# Altium footprint library Receiver_Library.PcbLib: 29 footprints (part 2 of 2)
Each footprint in its own frame and in the unit in brackets; x right, y up, seen from the top. Pads: shape width x height; smd on the part's side, far side on the other; paste and mask are expansions set on the pad; w line width, h text height; cw(c..) or ccw(c..) is an arc to the next point about the centre after c.
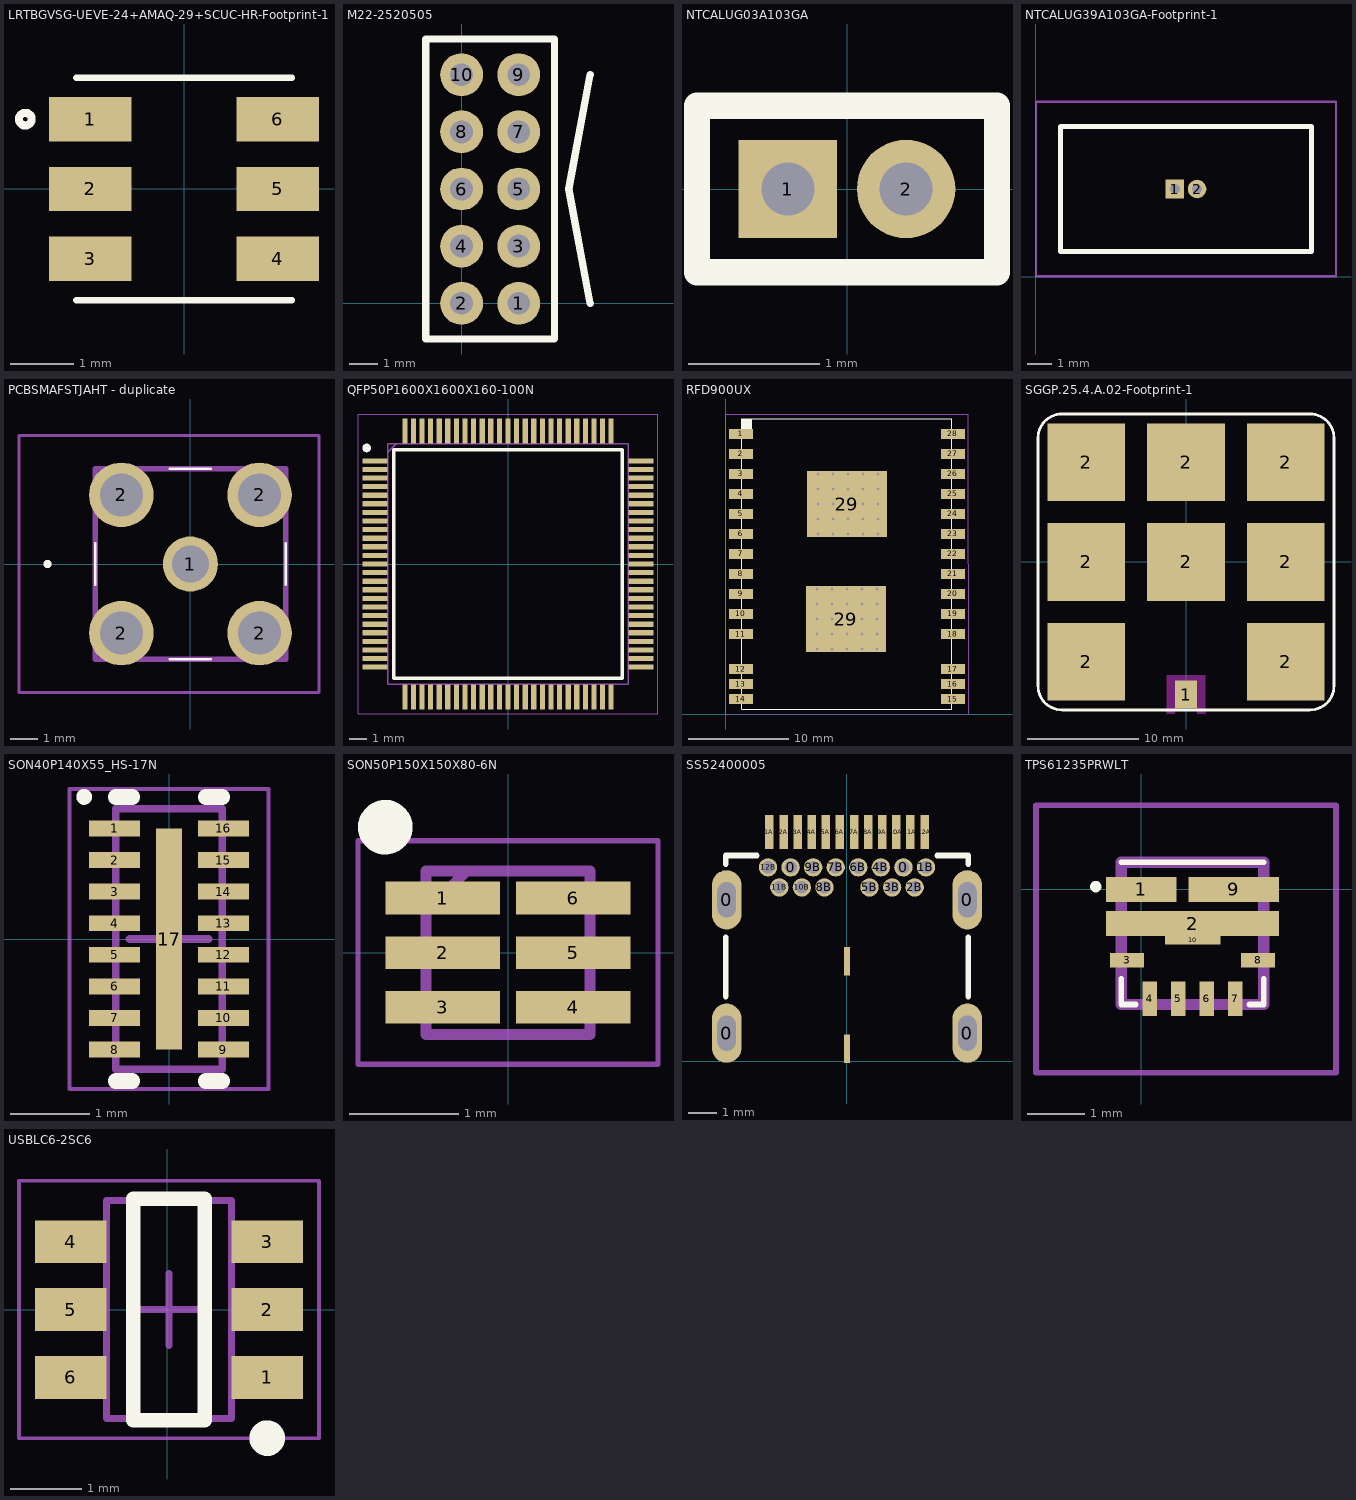
[diagram p1: the footprints below, top view; thin cyan lines are the x and y axes]

## LRTBGVSG-UEVE-24+AMAQ-29+SCUC-HR-Footprint-1 [mm]
pads (6):
  rect 1.3x0.7 smd: 1(-1.475,1.1) 2(-1.475,0) 3(-1.475,-1.1) 4(1.475,-1.1) 5(1.475,0) 6(1.475,1.1)
Top Overlay:
  circle w0.127: c-2.5,1.1 r0.1
  lines w0.1: -1.7,-1.75 1.7,-1.75 ; -1.7,1.75 1.7,1.75
3D body "LRTB_GVSG_20130110_geometry.STEP": height 1.8, standoff -0.03, extent -1.7,-1.65 1.7,1.65

## M22-2520505 [mm]
pads (10):
  round 1.5 hole 0.8: 1(2,0) 2(0,0) 3(2,2) 4(0,2) 5(2,4) 6(0,4) 7(2,6) 8(0,6) 9(2,8) 10(0,8)
Top Overlay:
  lines w0.254: 4.5,0 3.75,4 4.5,8 ; -1.25,-1.25 3.25,-1.25 3.25,9.25 -1.25,9.25 -1.25,-1.25
3D body "BF050-10-A-A-0350-0230-N-G.stp": height 5, standoff -2.3, extent -1,-1 3,9

## NTCALUG03A103GA [mm]
pads (2):
  rect 0.75x0.75 hole 0.402: 1(-0.45,0)
  round 0.75 hole 0.402: 2(0.45,0)
Top Overlay:
  lines w0.2: -1.143,-0.635 1.143,-0.635 1.143,0.635 -1.143,0.635 -1.143,-0.635
Mechanical 13:
  lines w0.1: -1.143,-0.635 1.143,-0.635 1.143,0.635 -1.143,0.635 -1.143,-0.635
Mechanical 15:
  lines w0.1: -1.143,-0.635 -1.143,0.635 1.143,0.635 1.143,-0.635 -1.143,-0.635
3D body "NTCALUG39A103GA.stp": height 79.21, standoff -2.32, extent -2.75,-1.65 2.75,1.738

## NTCALUG39A103GA-Footprint-1 [mm]
pads (2):
  rect 0.75x0.75 hole 0.402: 1(5.646,3.556)
  round 0.75 hole 0.402: 2(6.546,3.556)
Top Overlay:
  lines w0.2: 1.016,1.016 11.176,1.016 11.176,6.096 1.016,6.096 1.016,1.016
Mechanical 13:
  lines w0.1: 1.016,1.016 11.176,1.016 11.176,6.096 1.016,6.096 1.016,1.016
Mechanical 15:
  lines w0.1: 0.016,0.016 12.176,0.016 12.176,7.096 0.016,7.096 0.016,0.016
3D body "NTCALUG39A103GA.stp": height 79.21, standoff -2.32, extent 3.346,1.906 8.846,5.294

## PCBSMAFSTJAHT - duplicate [mm]
pads (5):
  round 2.025 hole 1.35: 1(0,0)
  round 2.37 hole 1.58: 2(-2.54,-2.54) 2(-2.54,2.54) 2(2.54,-2.54) 2(2.54,2.54)
Top Overlay:
  lines w0.1: -3.5,-0.75 -3.5,0.75 -3.5,-0.75 ; -0.75,-3.5 0.75,-3.5 -0.75,-3.5 ; -0.75,3.5 0.75,3.5 -0.75,3.5 ; 3.5,-0.75 3.5,0.75 3.5,-0.75
  lines w0.2: -5.3,0 ccw(c-5.25,0) -5.2,0 ; -5.3,0 cw(c-5.25,0) -5.2,0 ; -5.3,0 ccw(c-5.25,0) -5.2,0
Mechanical 13:
  lines w0.2: -3.5,-3.5 3.5,-3.5 3.5,3.5 -3.5,3.5 -3.5,-3.5
Mechanical 15:
  lines w0.1: -6.3,-4.725 4.725,-4.725 4.725,4.725 -6.3,4.725 -6.3,-4.725
3D body "PCB.SMAFSTJ.A.HT.stp": height 11, standoff 0, extent -3.61,-3.5 3.39,3.5

## QFP50P1600X1600X160-100N [mm]
pads (100):
  rect 1.475x0.3 smd: 1(-7.738,6) 2(-7.738,5.5) 3(-7.738,5) 4(-7.738,4.5) 5(-7.738,4) 6(-7.738,3.5) 7(-7.738,3) 8(-7.738,2.5) 9(-7.738,2) 10(-7.738,1.5) 11(-7.738,1) 12(-7.738,0.5) 13(-7.738,0) 14(-7.738,-0.5) 15(-7.738,-1) 16(-7.738,-1.5) 17(-7.738,-2) 18(-7.738,-2.5) 19(-7.738,-3) 20(-7.738,-3.5) 21(-7.738,-4) 22(-7.738,-4.5) 23(-7.738,-5) 24(-7.738,-5.5) 25(-7.738,-6) 51(7.738,-6) 52(7.738,-5.5) 53(7.738,-5) 54(7.738,-4.5) 55(7.738,-4) 56(7.738,-3.5) 57(7.738,-3) 58(7.738,-2.5) 59(7.738,-2) 60(7.738,-1.5) 61(7.738,-1) 62(7.738,-0.5) 63(7.738,0) 64(7.738,0.5) 65(7.738,1) 66(7.738,1.5) 67(7.738,2) 68(7.738,2.5) 69(7.738,3) 70(7.738,3.5) 71(7.738,4) 72(7.738,4.5) 73(7.738,5) 74(7.738,5.5) 75(7.738,6)
  rect 0.3x1.475 smd: 26(-6,-7.738) 27(-5.5,-7.738) 28(-5,-7.738) 29(-4.5,-7.738) 30(-4,-7.738) 31(-3.5,-7.738) 32(-3,-7.738) 33(-2.5,-7.738) 34(-2,-7.738) 35(-1.5,-7.738) 36(-1,-7.738) 37(-0.5,-7.738) 38(0,-7.738) 39(0.5,-7.738) 40(1,-7.738) 41(1.5,-7.738) 42(2,-7.738) 43(2.5,-7.738) 44(3,-7.738) 45(3.5,-7.738) 46(4,-7.738) 47(4.5,-7.738) 48(5,-7.738) 49(5.5,-7.738) 50(6,-7.738) 76(6,7.738) 77(5.5,7.738) 78(5,7.738) 79(4.5,7.738) 80(4,7.738) 81(3.5,7.738) 82(3,7.738) 83(2.5,7.738) 84(2,7.738) 85(1.5,7.738) 86(1,7.738) 87(0.5,7.738) 88(0,7.738) 89(-0.5,7.738) 90(-1,7.738) 91(-1.5,7.738) 92(-2,7.738) 93(-2.5,7.738) 94(-3,7.738) 95(-3.5,7.738) 96(-4,7.738) 97(-4.5,7.738) 98(-5,7.738) 99(-5.5,7.738) 100(-6,7.738)
Top Overlay:
  circle w0.25: c-8.225,6.75 r0.125
  lines w0.2: -6.65,-6.65 6.65,-6.65 6.65,6.65 -6.65,6.65 -6.65,-6.65
Mechanical 13:
  lines w0.1: -7,6.5 -6.5,7 ; -7,-7 7,-7 7,7 -7,7 -7,-7
Mechanical 15:
  lines w0.05: -8.725,-8.725 8.725,-8.725 8.725,8.725 -8.725,8.725 -8.725,-8.725
3D body "STM32L552VET6.stp": height 1.6, standoff 0, extent -8,-8 8,8

## RFD900UX [mm]
pads (30):
  rect 2.4x1 smd: 1(1.5,28) 2(1.5,26) 3(1.5,24) 4(1.5,22) 5(1.5,20) 6(1.5,18) 7(1.5,16) 8(1.5,14) 9(1.5,12) 10(1.5,10) 11(1.5,8) 12(1.5,4.5) 13(1.5,3) 14(1.5,1.5) 15(22.7,1.5) 16(22.7,3) 17(22.7,4.5) 18(22.7,8) 19(22.7,10) 20(22.7,12) 21(22.7,14) 22(22.7,16) 23(22.7,18) 24(22.7,20) 25(22.7,22) 26(22.7,24) 27(22.7,26) 28(22.7,28)
  rect 8x6.6 smd paste-8: 29(12,9.5) 29(12.1,21)
via 15.1,11 diameter 0.5 hole 0.3
via 13.6,11 diameter 0.5 hole 0.3
via 12.1,11 diameter 0.5 hole 0.3
via 10.6,11 diameter 0.5 hole 0.3
via 9.1,11 diameter 0.5 hole 0.3
via 9.1,8 diameter 0.5 hole 0.3
via 10.6,8 diameter 0.5 hole 0.3
via 15.1,8 diameter 0.5 hole 0.3
via 13.6,8 diameter 0.5 hole 0.3
via 12.1,8 diameter 0.5 hole 0.3
via 9.1,9.5 diameter 0.5 hole 0.3
via 10.6,9.5 diameter 0.5 hole 0.3
via 15.1,9.5 diameter 0.5 hole 0.3
via 13.6,9.5 diameter 0.5 hole 0.3
via 12.1,9.5 diameter 0.5 hole 0.3
via 15.1,12.5 diameter 0.5 hole 0.3
via 13.6,12.5 diameter 0.5 hole 0.3
via 12.1,12.5 diameter 0.5 hole 0.3
via 10.6,12.5 diameter 0.5 hole 0.3
via 9.1,12.5 diameter 0.5 hole 0.3
via 9.1,6.5 diameter 0.5 hole 0.3
via 10.6,6.5 diameter 0.5 hole 0.3
via 12.1,6.5 diameter 0.5 hole 0.3
via 13.6,6.5 diameter 0.5 hole 0.3
via 15.1,6.5 diameter 0.5 hole 0.3
via 15.2,18 diameter 0.5 hole 0.3
via 13.7,18 diameter 0.5 hole 0.3
via 12.2,18 diameter 0.5 hole 0.3
via 10.7,18 diameter 0.5 hole 0.3
via 9.2,18 diameter 0.5 hole 0.3
via 9.2,24 diameter 0.5 hole 0.3
via 10.7,24 diameter 0.5 hole 0.3
via 12.2,24 diameter 0.5 hole 0.3
via 13.7,24 diameter 0.5 hole 0.3
via 15.2,24 diameter 0.5 hole 0.3
via 12.2,21 diameter 0.5 hole 0.3
via 13.7,21 diameter 0.5 hole 0.3
via 15.2,21 diameter 0.5 hole 0.3
via 10.7,21 diameter 0.5 hole 0.3
via 9.2,21 diameter 0.5 hole 0.3
via 12.2,19.5 diameter 0.5 hole 0.3
via 13.7,19.5 diameter 0.5 hole 0.3
via 15.2,19.5 diameter 0.5 hole 0.3
via 10.7,19.5 diameter 0.5 hole 0.3
via 9.2,19.5 diameter 0.5 hole 0.3
via 9.2,22.5 diameter 0.5 hole 0.3
via 10.7,22.5 diameter 0.5 hole 0.3
via 12.2,22.5 diameter 0.5 hole 0.3
via 13.7,22.5 diameter 0.5 hole 0.3
via 15.2,22.5 diameter 0.5 hole 0.3
Top Overlay:
  rectangle: 1.6,28.5 2.6,29.5
  lines w0.1: 1.6,0.5 22.6,0.5 22.6,29.5 1.6,29.5 1.6,0.5
Top Paste:
  rectangle: 8.6,21.25 11.85,24
  rectangle: 12.35,21.25 15.6,24
  rectangle: 12.35,18 15.6,20.75
  rectangle: 8.6,18 11.85,20.75
  rectangle: 8.6,6.5 11.85,9.25
  rectangle: 12.35,6.5 15.6,9.25
  rectangle: 12.35,9.75 15.6,12.5
  rectangle: 8.6,9.75 11.85,12.5
Mechanical 2:
  lines w0.1: 0,0 0,30 24.2,30 24.2,0 0,0

## SGGP.25.4.A.02-Footprint-1 [mm]
pads (9):
  rect 2x2.5 smd paste+0: 1(0,-11.95)
  rect 7x7 smd paste+0: 2(-9,-9) 2(-9,0) 2(-9,9) 2(0,0) 2(0,9) 2(9,-9) 2(9,0) 2(9,9)
Top Overlay:
  lines w0.254: -13.335,-11.167 ccw(c-11.167,-11.167) -11.167,-13.335 11.167,-13.335 ccw(c11.167,-11.167) 13.335,-11.167 13.335,11.167 ccw(c11.167,11.167) 11.167,13.335 -11.167,13.335 ccw(c-11.167,11.167) -13.335,11.167 -13.335,4.445 -13.335,-11.167
Keep-Out Layer:
  region: -1,-10.7 -1,-13.7 -1.75,-13.7 -1.75,-10.2 1.75,-10.2 1.75,-13.7 1,-13.7 1,-10.7
3D body "SGGP.25.4.A.02.step": height 4.02, standoff -0.01, extent -12.5,-12.51 12.5,12.5

## SON40P140X55_HS-17N [mm]
pads (17):
  rect 0.65x0.2 smd: 1(-0.69,1.4) 2(-0.69,1) 3(-0.69,0.6) 4(-0.69,0.2) 5(-0.69,-0.2) 6(-0.69,-0.6) 7(-0.69,-1) 8(-0.69,-1.4) 9(0.69,-1.4) 10(0.69,-1) 11(0.69,-0.6) 12(0.69,-0.2) 13(0.69,0.2) 14(0.69,0.6) 15(0.69,1) 16(0.69,1.4)
  rect 0.33x2.8 smd: 17(0,0)
Top Overlay:
  circle w0.1: c-1.075,1.8 r0.05
  lines w0.2: -0.675,-1.8 -0.465,-1.8 ; -0.675,1.8 -0.465,1.8 ; 0.465,-1.8 0.675,-1.8 ; 0.465,1.8 0.675,1.8
Mechanical 13:
  lines w0.1: -0.675,-1.65 0.675,-1.65 0.675,1.65 -0.675,1.65 -0.675,-1.65
Mechanical 15:
  lines w0.05: -1.26,-1.9 1.26,-1.9 1.26,1.9 -1.26,1.9 -1.26,-1.9
  lines w0.1: -0.5,0 0.5,0 ; 0,-0.5 0,0.5
3D body "SON40P140X55_HS-17N.step": height 0.55, standoff 0, extent -0.725,-1.65 0.725,1.65

## SON50P150X150X80-6N [mm]
pads (6):
  rect 1.05x0.3 smd: 1(-0.6,0.5) 2(-0.6,0) 3(-0.6,-0.5) 4(0.6,-0.5) 5(0.6,0) 6(0.6,0.5)
Top Overlay:
  circle w0.25: c-1.125,1.15 r0.125
Mechanical 13:
  lines w0.1: -0.75,0.375 -0.375,0.75 ; -0.75,-0.75 0.75,-0.75 0.75,0.75 -0.75,0.75 -0.75,-0.75
Mechanical 15:
  lines w0.05: -1.375,-1.025 1.375,-1.025 1.375,1.025 -1.375,1.025 -1.375,-1.025
3D body "BQ29732DSER.stp": height 0.8, standoff 0, extent -0.75,-0.75 0.75,0.75

## SS52400005 [mm]
pads (32):
  oval 1.05x2.1 hole 0.65 slot 1.25 at 90 deg: 0(-4.266,0.998) 0(-4.266,5.728) 0(4.274,0.998) 0(4.274,5.728)
  round 0.65 hole 0.45: 0(-1.996,6.878) 0(2.004,6.878) 1B(2.804,6.878) 2B(2.404,6.168) 3B(1.604,6.168) 4B(1.204,6.878) 5B(0.804,6.168) 6B(0.404,6.878) 7B(-0.396,6.878) 8B(-0.796,6.168) 9B(-1.196,6.878) 10B(-1.596,6.168) 11B(-2.396,6.168) 12B(-2.796,6.878)
  rect 0.2x1 smd: 0(0.004,0.448) 0(0.004,3.548)
  rect 0.3x1.2 smd: 1A(-2.746,8.128) 2A(-2.246,8.128) 3A(-1.746,8.128) 4A(-1.246,8.128) 5A(-0.746,8.128) 6A(-0.246,8.128) 7A(0.254,8.128) 8A(0.754,8.128) 9A(1.254,8.128) 10A(1.754,8.128) 11A(2.254,8.128) 12A(2.754,8.128)
Top Overlay:
  lines w0.2: -4.296,2.298 -4.296,4.398 ; -4.296,6.998 -4.296,7.298 -3.196,7.298 ; 3.204,7.298 4.304,7.298 4.304,6.998 ; 4.304,2.298 4.304,4.398
3D body "SS-52400-003.STEP": height 3.03, standoff -1.83, extent -4.366,-3.402 4.374,8.427

## TPS61235PRWLT [mm]
pads (10):
  rect 1.24x0.44 smd: 1(0,0)
  rect 3.04x0.44 smd: 2(0.9,-0.6)
  rect 0.6x0.25 smd: 3(-0.25,-1.245) 8(2.05,-1.245)
  rect 0.25x0.6 smd: 4(0.15,-1.92) 5(0.65,-1.92) 6(1.15,-1.92) 7(1.65,-1.92)
  rect 1.59x0.44 smd: 9(1.625,0)
  rect 0.975x0.15 smd: 10(0.9,-0.895)
Top Overlay:
  lines w0.1: -0.35,-1.57 -0.35,-2.02 -0.1,-2.02 ; -0.35,0.48 2.15,0.48 ; 1.9,-2.02 2.15,-2.02 2.15,-1.57 ; -0.8,0 ccw(c-0.8,0.05) -0.8,0.1 ccw(c-0.8,0.05) -0.8,0
Mechanical 13:
  lines w0.2: -0.35,-2.02 2.15,-2.02 2.15,0.48 -0.35,0.48 -0.35,-2.02
Mechanical 15:
  lines w0.1: -1.85,-3.22 3.42,-3.22 3.42,1.48 -1.85,1.48 -1.85,-3.22
3D body "TPS61236PRWLR.stp": height 1, standoff 0, extent -0.37,-2.12 2.13,0.38

## USBLC6-2SC6 [mm]
pads (6):
  rect 1x0.6 smd: 1(1.397,-0.95) 2(1.397,0) 3(1.397,0.95) 4(-1.353,0.95) 5(-1.353,0) 6(-1.353,-0.95)
Top Overlay:
  circle w0.25: c1.397,-1.8 r0.125
  lines w0.2: -0.478,-1.55 -0.478,1.55 0.522,1.55 0.522,-1.55 -0.478,-1.55
Mechanical 13:
  lines w0.1: -0.853,-1.525 0.897,-1.525 0.897,1.525 -0.853,1.525 -0.853,-1.525
Mechanical 15:
  lines w0.05: -2.078,-1.8 2.122,-1.8 2.122,1.8 -2.078,1.8 -2.078,-1.8
  lines w0.1: -0.478,0 0.522,0 ; 0.022,-0.5 0.022,0.5
3D body "SOT95P280X145-6N.step": height 1.45, standoff 0, extent -1.578,-1.525 1.622,1.525